# Altium footprint library SAMTEC SMD.PcbLib: 165 footprints (part 10 of 17) (continued)
## SAMTEC_QSH-030-01-L-D-A [mm] "60 (2x30) Contacts, Pitch 0.5mm, Straight Double Row High Speed Ground Plane Socket"
height 3.25
pads (66):
  rect 0.279x2.27 smd mask+0: 1(-7.25,-2.865) 2(-7.25,2.865) 3(-6.75,-2.865) 4(-6.75,2.865) 5(-6.25,-2.865) 6(-6.25,2.865) 7(-5.75,-2.865) 8(-5.75,2.865) 9(-5.25,-2.865) 10(-5.25,2.865) 11(-4.75,-2.865) 12(-4.75,2.865) 13(-4.25,-2.865) 14(-4.25,2.865) 15(-3.75,-2.865) 16(-3.75,2.865) 17(-3.25,-2.865) 18(-3.25,2.865) 19(-2.75,-2.865) 20(-2.75,2.865) 21(-2.25,-2.865) 22(-2.25,2.865) 23(-1.75,-2.865) 24(-1.75,2.865) 25(-1.25,-2.865) 26(-1.25,2.865) 27(-0.75,-2.865) 28(-0.75,2.865) 29(-0.25,-2.865) 30(-0.25,2.865) 31(0.25,-2.865) 32(0.25,2.865) 33(0.75,-2.865) 34(0.75,2.865) 35(1.25,-2.865) 36(1.25,2.865) 37(1.75,-2.865) 38(1.75,2.865) 39(2.25,-2.865) 40(2.25,2.865) 41(2.75,-2.865) 42(2.75,2.865) 43(3.25,-2.865) 44(3.25,2.865) 45(3.75,-2.865) 46(3.75,2.865) 47(4.25,-2.865) 48(4.25,2.865) 49(4.75,-2.865) 50(4.75,2.865) 51(5.25,-2.865) 52(5.25,2.865) 53(5.75,-2.865) 54(5.75,2.865) 55(6.25,-2.865) 56(6.25,2.865) 57(6.75,-2.865) 58(6.75,2.865) 59(7.25,-2.865) 60(7.25,2.865)
  rect 2.54x0.43 smd mask+0: 61(-8.065,0) 64(8.065,0)
  rect 4.7x0.43 smd mask+0: 62(-3.175,0) 63(3.175,0)
  round 0.5 hole 1 unplated mask+0.25: 65(-10.066,2.67) 66(10.066,2.67)
Top Overlay:
  circle w0.25: c-7.992,-4.264 r0.125
  lines w0.2: -10.674,2.007 -10.674,-3.62 -7.79,-3.62 ; -10.674,3.333 -10.674,3.62 -7.79,3.62 ; -9.848,1.797 -10.262,1.383 -10.262,-3.112 -7.79,-3.112 ; -9.193,2.452 -8.533,3.112 -7.79,3.112 ; -7.806,-1.905 -8.325,-1.905 -8.325,-0.737 -7.753,-0.737 ; -7.806,1.905 -8.325,1.905 -8.325,0.737 -7.753,0.737 -7.753,0.425 ; 7.741,-0.425 7.741,-0.73 8.312,-0.73 8.312,-1.905 7.793,-1.905 ; 7.741,0.425 7.741,0.73 8.312,0.73 8.312,1.905 7.793,1.905 ; 7.79,-3.62 10.636,-3.62 10.636,1.974 ; 7.79,-3.112 10.224,-3.112 10.224,1.383 9.795,1.812 ; 7.79,3.112 8.495,3.112 9.208,2.398 ; 7.79,3.62 10.636,3.62 10.636,3.366
Mechanical 8:
  drawing of 396 lines, arcs and shapes, not listed
Mechanical 14:
  circle w0.1: c-7.99,-4.264 r0.25
  lines w0.1: -10.674,-3.62 10.636,-3.62 10.636,3.62 -10.674,3.62 -10.674,-3.62 ; -10.262,-3.112 10.224,-3.112 10.224,1.383 8.495,3.112 -8.533,3.112 -10.262,1.383 -10.262,-3.112 ; -8.325,-1.905 -8.325,-0.737 -7.753,-0.737 -7.753,-0.425 7.741,-0.425 7.741,-0.73 8.312,-0.73 8.312,-1.905 -8.325,-1.905 ; -8.325,0.737 -8.325,1.905 8.312,1.905 8.312,0.73 7.741,0.73 7.741,0.425 -7.753,0.425 -7.753,0.737 -8.325,0.737 ; -7.967,-0.267 -5.427,-0.267 -5.427,0 -7.967,0 -7.967,-0.267 ; -3.501,0 -0.961,0 -0.961,0.267 -3.501,0.267 -3.501,0 ; 0.964,-0.267 3.504,-0.267 3.504,0 0.964,0 0.964,-0.267 ; 5.429,0 7.969,0 7.969,0.267 5.429,0.267 5.429,0
Mechanical 15:
  lines w0.05: -10.924,-4.25 10.886,-4.25 10.886,4.25 -10.924,4.25 -10.924,-4.25
3D body "SAMTEC_QSH-030-01-L-D-A.stp": height 3.25, standoff -0.75, extent -10.674,-3.874 10.636,3.62

## SAMTEC_QSH-060-01-L-D-A [mm] "120 (2x30x2) Contacts, Pitch 0.5mm, Straight Double Row High Speed Ground Plane Socket"
height 3.25
pads (130):
  rect 0.279x2.27 smd mask+0: 1(-17.251,-2.865) 2(-17.251,2.865) 3(-16.751,-2.865) 4(-16.751,2.865) 5(-16.251,-2.865) 6(-16.251,2.865) 7(-15.751,-2.865) 8(-15.751,2.865) 9(-15.251,-2.865) 10(-15.251,2.865) 11(-14.751,-2.865) 12(-14.751,2.865) 13(-14.251,-2.865) 14(-14.251,2.865) 15(-13.751,-2.865) 16(-13.751,2.865) 17(-13.251,-2.865) 18(-13.251,2.865) 19(-12.751,-2.865) 20(-12.751,2.865) 21(-12.251,-2.865) 22(-12.251,2.865) 23(-11.751,-2.865) 24(-11.751,2.865) 25(-11.251,-2.865) 26(-11.251,2.865) 27(-10.751,-2.865) 28(-10.751,2.865) 29(-10.251,-2.865) 30(-10.251,2.865) 31(-9.751,-2.865) 32(-9.751,2.865) 33(-9.251,-2.865) 34(-9.251,2.865) 35(-8.751,-2.865) 36(-8.751,2.865) 37(-8.251,-2.865) 38(-8.251,2.865) 39(-7.751,-2.865) 40(-7.751,2.865) 41(-7.251,-2.865) 42(-7.251,2.865) 43(-6.751,-2.865) 44(-6.751,2.865) 45(-6.251,-2.865) 46(-6.251,2.865) 47(-5.751,-2.865) 48(-5.751,2.865) 49(-5.251,-2.865) 50(-5.251,2.865) 51(-4.751,-2.865) 52(-4.751,2.865) 53(-4.251,-2.865) 54(-4.251,2.865) 55(-3.751,-2.865) 56(-3.751,2.865) 57(-3.251,-2.865) 58(-3.251,2.865) 59(-2.751,-2.865) 60(-2.751,2.865) 61(2.751,-2.865) 62(2.751,2.865) 63(3.251,-2.865) 64(3.251,2.865) 65(3.751,-2.865) 66(3.751,2.865) 67(4.251,-2.865) 68(4.251,2.865) 69(4.751,-2.865) 70(4.751,2.865) 71(5.251,-2.865) 72(5.251,2.865) 73(5.751,-2.865) 74(5.751,2.865) 75(6.251,-2.865) 76(6.251,2.865) 77(6.751,-2.865) 78(6.751,2.865) 79(7.251,-2.865) 80(7.251,2.865) 81(7.751,-2.865) 82(7.751,2.865) 83(8.251,-2.865) 84(8.251,2.865) 85(8.751,-2.865) 86(8.751,2.865) 87(9.251,-2.865) 88(9.251,2.865) 89(9.751,-2.865) 90(9.751,2.865) 91(10.251,-2.865) 92(10.251,2.865) 93(10.751,-2.865) 94(10.751,2.865) 95(11.251,-2.865) 96(11.251,2.865) 97(11.751,-2.865) 98(11.751,2.865) 99(12.251,-2.865) 100(12.251,2.865) 101(12.751,-2.865) 102(12.751,2.865) 103(13.251,-2.865) 104(13.251,2.865) 105(13.751,-2.865) 106(13.751,2.865) 107(14.251,-2.865) 108(14.251,2.865) 109(14.751,-2.865) 110(14.751,2.865) 111(15.251,-2.865) 112(15.251,2.865) 113(15.751,-2.865) 114(15.751,2.865) 115(16.251,-2.865) 116(16.251,2.865) 117(16.751,-2.865) 118(16.751,2.865) 119(17.251,-2.865) 120(17.251,2.865)
  rect 2.54x0.43 smd mask+0: 121(-18.066,0) 124(-1.936,0) 125(1.936,0) 128(18.066,0)
  rect 4.7x0.43 smd mask+0: 122(-13.176,0) 123(-6.826,0) 126(6.826,0) 127(13.176,0)
  round 0.5 hole 1 unplated mask+0.25: 129+(-20.068,2.67) 130(20.066,2.67)
Top Overlay:
  circle w0.25: c-17.993,-4.264 r0.125
  lines w0.2: -20.684,2.015 -20.684,-3.62 -17.791,-3.62 ; -20.684,3.325 -20.684,3.62 -17.791,3.62 ; -20.205,1.781 -20.272,1.714 -20.272,-3.112 -17.791,-3.112 ; -19.177,2.809 -18.875,3.112 -17.791,3.112 ; -17.791,-1.905 -18.334,-1.905 -18.334,-0.737 -17.763,-0.737 -17.763,-0.425 ; -17.791,1.905 -18.334,1.905 -18.334,0.737 -17.763,0.737 -17.763,0.425 ; -2.269,-0.425 -2.269,-0.73 -1.697,-0.73 -1.697,-1.905 -2.241,-1.905 ; -2.269,0.425 -2.269,0.73 -1.697,0.73 -1.697,1.905 -2.241,1.905 ; -2.212,-3.62 2.212,-3.62 ; -2.212,-3.112 2.212,-3.112 ; -2.212,3.112 2.212,3.112 ; -2.212,3.62 2.212,3.62 ; 2.212,-1.905 1.668,-1.905 1.668,-0.737 2.24,-0.737 2.24,-0.425 ; 2.212,1.905 1.668,1.905 1.668,0.737 2.24,0.737 2.24,0.425 ; 17.734,-0.425 17.734,-0.73 18.305,-0.73 18.305,-1.905 17.762,-1.905 ; 17.734,0.425 17.734,0.73 18.305,0.73 18.305,1.905 17.762,1.905 ; 17.791,-3.62 20.629,-3.62 20.629,1.968 ; 17.791,-3.112 20.217,-3.112 20.217,1.714 20.157,1.775 ; 17.791,3.112 18.82,3.112 19.171,2.761 ; 17.791,3.62 20.629,3.62 20.629,3.372
Mechanical 8:
  drawing of 780 lines, arcs and shapes, not listed
Mechanical 14:
  circle w0.1: c-17.991,-4.264 r0.25
  lines w0.1: -20.684,-3.62 20.629,-3.62 20.629,3.62 -20.684,3.62 -20.684,-3.62 ; -20.272,-3.112 -20.272,1.714 -18.875,3.112 18.82,3.112 20.217,1.714 20.217,-3.112 -20.272,-3.112 ; -18.334,-1.905 -18.334,-0.737 -17.763,-0.737 -17.763,-0.425 -2.269,-0.425 -2.269,-0.73 -1.697,-0.73 -1.697,-1.905 -18.334,-1.905 ; -18.334,0.737 -17.763,0.737 -17.763,0.425 -2.269,0.425 -2.269,0.73 -1.697,0.73 -1.697,1.905 -18.334,1.905 -18.334,0.737 ; -17.976,-0.267 -15.436,-0.267 -15.436,0 -17.976,0 -17.976,-0.267 ; -13.511,0 -10.971,0 -10.971,0.267 -13.511,0.267 -13.511,0 ; -9.046,-0.267 -6.506,-0.267 -6.506,0 -9.046,0 -9.046,-0.267 ; -4.58,0 -4.58,0.267 -2.04,0.267 -2.04,0 -4.58,0 ; 1.668,-1.905 18.305,-1.905 18.305,-0.73 17.734,-0.73 17.734,-0.425 2.24,-0.425 2.24,-0.737 1.668,-0.737 1.668,-1.905 ; 1.668,0.737 1.668,1.905 18.305,1.905 18.305,0.73 17.734,0.73 17.734,0.425 2.24,0.425 2.24,0.737 1.668,0.737 ; 2.026,-0.267 2.026,0 4.566,0 4.566,-0.267 2.026,-0.267 ; 6.492,0 6.492,0.267 9.032,0.267 9.032,0 6.492,0 ; 10.957,-0.267 13.497,-0.267 13.497,0 10.957,0 10.957,-0.267 ; 15.422,0 17.962,0 17.962,0.267 15.422,0.267 15.422,0
Mechanical 15:
  lines w0.05: -20.934,-4.25 -20.934,4.25 20.879,4.25 20.879,-4.25 -20.934,-4.25
3D body "SAMTEC_QSH-060-01-L-D-A.stp": height 3.25, standoff -0.75, extent -20.684,-3.746 20.629,3.747

## SAMTEC_QSH-090-01-L-D-A [mm] "180 (3x2x30) Contacts, Pitch 0.5mm, Straight Double Row High Speed Ground Plane Socket"
height 3.25
pads (194):
  rect 0.279x2.27 smd mask+0: 1(-27.252,-2.865) 2(-27.252,2.865) 3(-26.752,-2.865) 4(-26.752,2.865) 5(-26.252,-2.865) 6(-26.252,2.865) 7(-25.752,-2.865) 8(-25.752,2.865) 9(-25.252,-2.865) 10(-25.252,2.865) 11(-24.752,-2.865) 12(-24.752,2.865) 13(-24.252,-2.865) 14(-24.252,2.865) 15(-23.752,-2.865) 16(-23.752,2.865) 17(-23.252,-2.865) 18(-23.252,2.865) 19(-22.752,-2.865) 20(-22.752,2.865) 21(-22.252,-2.865) 22(-22.252,2.865) 23(-21.752,-2.865) 24(-21.752,2.865) 25(-21.252,-2.865) 26(-21.252,2.865) 27(-20.752,-2.865) 28(-20.752,2.865) 29(-20.252,-2.865) 30(-20.252,2.865) 31(-19.752,-2.865) 32(-19.752,2.865) 33(-19.252,-2.865) 34(-19.252,2.865) 35(-18.752,-2.865) 36(-18.752,2.865) 37(-18.252,-2.865) 38(-18.252,2.865) 39(-17.752,-2.865) 40(-17.752,2.865) 41(-17.252,-2.865) 42(-17.252,2.865) 43(-16.752,-2.865) 44(-16.752,2.865) 45(-16.252,-2.865) 46(-16.252,2.865) 47(-15.752,-2.865) 48(-15.752,2.865) 49(-15.252,-2.865) 50(-15.252,2.865) 51(-14.752,-2.865) 52(-14.752,2.865) 53(-14.252,-2.865) 54(-14.252,2.865) 55(-13.752,-2.865) 56(-13.752,2.865) 57(-13.252,-2.865) 58(-13.252,2.865) 59(-12.752,-2.865) 60(-12.752,2.865) 61(-7.25,-2.865) 62(-7.25,2.865) 63(-6.75,-2.865) 64(-6.75,2.865) 65(-6.25,-2.865) 66(-6.25,2.865) 67(-5.75,-2.865) 68(-5.75,2.865) 69(-5.25,-2.865) 70(-5.25,2.865) 71(-4.75,-2.865) 72(-4.75,2.865) 73(-4.25,-2.865) 74(-4.25,2.865) 75(-3.75,-2.865) 76(-3.75,2.865) 77(-3.25,-2.865) 78(-3.25,2.865) 79(-2.75,-2.865) 80(-2.75,2.865) 81(-2.25,-2.865) 82(-2.25,2.865) 83(-1.75,-2.865) 84(-1.75,2.865) 85(-1.25,-2.865) 86(-1.25,2.865) 87(-0.75,-2.865) 88(-0.75,2.865) 89(-0.25,-2.865) 90(-0.25,2.865) 91(0.25,-2.865) 92(0.25,2.865) 93(0.75,-2.865) 94(0.75,2.865) 95(1.25,-2.865) 96(1.25,2.865) 97(1.75,-2.865) 98(1.75,2.865) 99(2.25,-2.865) 100(2.25,2.865) 101(2.75,-2.865) 102(2.75,2.865) 103(3.25,-2.865) 104(3.25,2.865) 105(3.75,-2.865) 106(3.75,2.865) 107(4.25,-2.865) 108(4.25,2.865) 109(4.75,-2.865) 110(4.75,2.865) 111(5.25,-2.865) 112(5.25,2.865) 113(5.75,-2.865) 114(5.75,2.865) 115(6.25,-2.865) 116(6.25,2.865) 117(6.75,-2.865) 118(6.75,2.865) 119(7.25,-2.865) 120(7.25,2.865) 121(12.753,-2.865) 122(12.753,2.865) 123(13.253,-2.865) 124(13.253,2.865) 125(13.753,-2.865) 126(13.753,2.865) 127(14.253,-2.865) 128(14.253,2.865) 129(14.753,-2.865) 130(14.753,2.865) 131(15.253,-2.865) 132(15.253,2.865) 133(15.753,-2.865) 134(15.753,2.865) 135(16.253,-2.865) 136(16.253,2.865) 137(16.753,-2.865) 138(16.753,2.865) 139(17.253,-2.865) 140(17.253,2.865) 141(17.753,-2.865) 142(17.753,2.865) 143(18.253,-2.865) 144(18.253,2.865) 145(18.753,-2.865) 146(18.753,2.865) 147(19.253,-2.865) 148(19.253,2.865) 149(19.753,-2.865) 150(19.753,2.865) 151(20.253,-2.865) 152(20.253,2.865) 153(20.753,-2.865) 154(20.753,2.865) 155(21.253,-2.865) 156(21.253,2.865) 157(21.753,-2.865) 158(21.753,2.865) 159(22.253,-2.865) 160(22.253,2.865) 161(22.753,-2.865) 162(22.753,2.865) 163(23.253,-2.865) 164(23.253,2.865) 165(23.753,-2.865) 166(23.753,2.865) 167(24.253,-2.865) 168(24.253,2.865) 169(24.753,-2.865) 170(24.753,2.865) 171(25.253,-2.865) 172(25.253,2.865) 173(25.753,-2.865) 174(25.753,2.865) 175(26.253,-2.865) 176(26.253,2.865) 177(26.753,-2.865) 178(26.753,2.865) 179(27.253,-2.865) 180(27.253,2.865)
  rect 2.54x0.43 smd mask+0: 181(-28.067,0) 184(-11.937,0) 185(-8.065,0) 188(8.065,0) 189(11.938,0) 192(28.068,0)
  rect 4.7x0.43 smd mask+0: 182(-23.177,0) 183(-16.827,0) 186(-3.175,0) 187(3.175,0) 190(16.828,0) 191(23.178,0)
  round 0.5 hole 1 unplated mask+0.25: 193(-30.069,2.67) 194(30.069,2.67)
Top Overlay:
  lines w0.2: -27.792,-3.617 -30.722,-3.617 -30.722,3.617 -27.792,3.617 ; -27.792,-3.109 -30.31,-3.109 -30.31,1.381 -28.583,3.109 -27.792,3.109 ; -27.792,-1.904 -28.311,-1.904 -28.311,-0.736 -27.74,-0.736 ; -27.792,1.903 -28.311,1.903 -28.311,0.736 -27.74,0.736 ; -12.258,-0.73 -11.686,-0.73 -11.686,-1.904 -12.213,-1.904 ; -12.258,0.73 -11.686,0.73 -11.686,1.903 -12.213,1.903 ; -12.213,-3.617 -7.789,-3.617 ; -12.213,-3.109 -7.789,-3.109 ; -12.213,3.109 -7.789,3.109 ; -12.213,3.617 -7.789,3.617 ; -7.789,-1.904 -8.339,-1.904 -8.339,-0.736 -7.768,-0.736 ; -7.789,1.903 -8.339,1.903 -8.339,0.736 -7.768,0.736 ; 7.715,-0.73 8.286,-0.73 8.286,-1.904 7.79,-1.904 ; 7.715,0.73 8.286,0.73 8.286,1.903 7.79,1.903 ; 7.79,-3.617 12.213,-3.617 ; 7.79,-3.109 12.213,-3.109 ; 7.79,3.109 12.213,3.109 ; 7.79,3.617 12.213,3.617 ; 12.213,-1.904 11.649,-1.904 11.649,-0.736 12.22,-0.736 ; 12.213,1.903 11.649,1.903 11.649,0.736 12.22,0.736 ; 27.702,-0.73 28.273,-0.73 28.273,-1.904 27.792,-1.904 ; 27.702,0.73 28.273,0.73 28.273,1.903 27.792,1.903 ; 27.792,-3.617 30.595,-3.617 30.595,3.617 27.792,3.617 ; 27.792,-3.109 30.183,-3.109 30.183,1.381 28.456,3.109 27.792,3.109
Mechanical 8:
  drawing of 1169 lines, arcs and shapes, not listed
Mechanical 14:
  lines w0.1: -30.722,-3.617 -30.722,3.617 30.595,3.617 30.595,-3.617 -30.722,-3.617 ; -30.31,-3.109 -30.31,1.381 -28.583,3.109 28.456,3.109 30.183,1.381 30.183,-3.109 -30.31,-3.109 ; -28.311,-1.904 -11.686,-1.904 -11.686,-0.73 -12.258,-0.73 -12.258,-0.425 -27.74,-0.425 -27.74,-0.736 -28.311,-0.736 -28.311,-1.904 ; -28.311,0.736 -28.311,1.903 -11.686,1.903 -11.686,0.73 -12.258,0.73 -12.258,0.425 -27.74,0.425 -27.74,0.736 -28.311,0.736 ; -27.953,-0.267 -25.415,-0.267 -25.415,0 -27.953,0 -27.953,-0.267 ; -23.491,0 -23.491,0.266 -20.953,0.266 -20.953,0 -23.491,0 ; -19.029,-0.267 -19.029,0 -16.491,0 -16.491,-0.267 -19.029,-0.267 ; -14.567,0 -14.567,0.266 -12.029,0.266 -12.029,0 -14.567,0 ; -8.339,-1.904 8.286,-1.904 8.286,-0.73 7.715,-0.73 7.715,-0.425 -7.768,-0.425 -7.768,-0.736 -8.339,-0.736 -8.339,-1.904 ; -8.339,0.736 -8.339,1.903 8.286,1.903 8.286,0.73 7.715,0.73 7.715,0.425 -7.768,0.425 -7.768,0.736 -8.339,0.736 ; -7.981,-0.267 -5.443,-0.267 -5.443,0 -7.981,0 -7.981,-0.267 ; -3.519,0 -3.519,0.266 -0.981,0.266 -0.981,0 -3.519,0 ; 0.943,-0.267 0.943,0 3.481,0 3.481,-0.267 0.943,-0.267 ; 5.405,0 5.405,0.266 7.943,0.266 7.943,0 5.405,0 ; 11.649,-1.904 28.273,-1.904 28.273,-0.73 27.702,-0.73 27.702,-0.425 12.22,-0.425 12.22,-0.736 11.649,-0.736 11.649,-1.904 ; 11.649,0.736 11.649,1.903 28.273,1.903 28.273,0.73 27.702,0.73 27.702,0.425 12.22,0.425 12.22,0.736 11.649,0.736 ; 12.006,-0.267 14.545,-0.267 14.545,0 12.006,0 12.006,-0.267 ; 16.468,0 16.468,0.266 19.006,0.266 19.006,0 16.468,0 ; 20.93,-0.267 20.93,0 23.468,0 23.468,-0.267 20.93,-0.267 ; 25.392,0 25.392,0.266 27.93,0.266 27.93,0 25.392,0
Mechanical 15:
  lines w0.05: -30.972,-4.25 -30.972,4.25 30.845,4.25 30.845,-4.25 -30.972,-4.25
3D body "SAMTEC_QSH-090-01-L-D-A.stp": height 3.17, standoff -0.82, extent -30.729,-3.744 30.603,3.744

## SAMTEC_QSH-120-01-L-D-A [mm] "240 (4x2x30) Contacts, Pitch 0.5mm, Straight Double Row High Speed Ground Plane Socket"
height 3.25
pads (258):
  rect 0.279x2.27 smd mask+0: 1(-37.254,-2.865) 2(-37.254,2.865) 3(-36.754,-2.865) 4(-36.754,2.865) 5(-36.254,-2.865) 6(-36.254,2.865) 7(-35.754,-2.865) 8(-35.754,2.865) 9(-35.254,-2.865) 10(-35.254,2.865) 11(-34.754,-2.865) 12(-34.754,2.865) 13(-34.254,-2.865) 14(-34.254,2.865) 15(-33.754,-2.865) 16(-33.754,2.865) 17(-33.254,-2.865) 18(-33.254,2.865) 19(-32.754,-2.865) 20(-32.754,2.865) 21(-32.254,-2.865) 22(-32.254,2.865) 23(-31.754,-2.865) 24(-31.754,2.865) 25(-31.254,-2.865) 26(-31.254,2.865) 27(-30.754,-2.865) 28(-30.754,2.865) 29(-30.254,-2.865) 30(-30.254,2.865) 31(-29.754,-2.865) 32(-29.754,2.865) 33(-29.254,-2.865) 34(-29.254,2.865) 35(-28.754,-2.865) 36(-28.754,2.865) 37(-28.254,-2.865) 38(-28.254,2.865) 39(-27.754,-2.865) 40(-27.754,2.865) 41(-27.254,-2.865) 42(-27.254,2.865) 43(-26.754,-2.865) 44(-26.754,2.865) 45(-26.254,-2.865) 46(-26.254,2.865) 47(-25.754,-2.865) 48(-25.754,2.865) 49(-25.254,-2.865) 50(-25.254,2.865) 51(-24.754,-2.865) 52(-24.754,2.865) 53(-24.254,-2.865) 54(-24.254,2.865) 55(-23.754,-2.865) 56(-23.754,2.865) 57(-23.254,-2.865) 58(-23.254,2.865) 59(-22.754,-2.865) 60(-22.754,2.865) 61(-17.251,-2.865) 62(-17.251,2.865) 63(-16.751,-2.865) 64(-16.751,2.865) 65(-16.251,-2.865) 66(-16.251,2.865) 67(-15.751,-2.865) 68(-15.751,2.865) 69(-15.251,-2.865) 70(-15.251,2.865) 71(-14.751,-2.865) 72(-14.751,2.865) 73(-14.251,-2.865) 74(-14.251,2.865) 75(-13.751,-2.865) 76(-13.751,2.865) 77(-13.251,-2.865) 78(-13.251,2.865) 79(-12.751,-2.865) 80(-12.751,2.865) 81(-12.251,-2.865) 82(-12.251,2.865) 83(-11.751,-2.865) 84(-11.751,2.865) 85(-11.251,-2.865) 86(-11.251,2.865) 87(-10.751,-2.865) 88(-10.751,2.865) 89(-10.251,-2.865) 90(-10.251,2.865) 91(-9.751,-2.865) 92(-9.751,2.865) 93(-9.251,-2.865) 94(-9.251,2.865) 95(-8.751,-2.865) 96(-8.751,2.865) 97(-8.251,-2.865) 98(-8.251,2.865) 99(-7.751,-2.865) 100(-7.751,2.865) 101(-7.251,-2.865) 102(-7.251,2.865) 103(-6.751,-2.865) 104(-6.751,2.865) 105(-6.251,-2.865) 106(-6.251,2.865) 107(-5.751,-2.865) 108(-5.751,2.865) 109(-5.251,-2.865) 110(-5.251,2.865) 111(-4.751,-2.865) 112(-4.751,2.865) 113(-4.251,-2.865) 114(-4.251,2.865) 115(-3.751,-2.865) 116(-3.751,2.865) 117(-3.251,-2.865) 118(-3.251,2.865) 119(-2.751,-2.865) 120(-2.751,2.865) 121(2.751,-2.865) 122(2.751,2.865) 123(3.251,-2.865) 124(3.251,2.865) 125(3.751,-2.865) 126(3.751,2.865) 127(4.251,-2.865) 128(4.251,2.865) 129(4.751,-2.865) 130(4.751,2.865) 131(5.251,-2.865) 132(5.251,2.865) 133(5.751,-2.865) 134(5.751,2.865) 135(6.251,-2.865) 136(6.251,2.865) 137(6.751,-2.865) 138(6.751,2.865) 139(7.251,-2.865) 140(7.251,2.865) 141(7.751,-2.865) 142(7.751,2.865) 143(8.251,-2.865) 144(8.251,2.865) 145(8.751,-2.865) 146(8.751,2.865) 147(9.251,-2.865) 148(9.251,2.865) 149(9.751,-2.865) 150(9.751,2.865) 151(10.251,-2.865) 152(10.251,2.865) 153(10.751,-2.865) 154(10.751,2.865) 155(11.251,-2.865) 156(11.251,2.865) 157(11.751,-2.865) 158(11.751,2.865) 159(12.251,-2.865) 160(12.251,2.865) 161(12.751,-2.865) 162(12.751,2.865) 163(13.251,-2.865) 164(13.251,2.865) 165(13.751,-2.865) 166(13.751,2.865) 167(14.251,-2.865) 168(14.251,2.865) 169(14.751,-2.865) 170(14.751,2.865) 171(15.251,-2.865) 172(15.251,2.865) 173(15.751,-2.865) 174(15.751,2.865) 175(16.251,-2.865) 176(16.251,2.865) 177(16.751,-2.865) 178(16.751,2.865) 179(17.251,-2.865) 180(17.251,2.865) 181(22.754,-2.865) 182(22.754,2.865) 183(23.254,-2.865) 184(23.254,2.865) 185(23.754,-2.865) 186(23.754,2.865) 187(24.254,-2.865) 188(24.254,2.865) 189(24.754,-2.865) 190(24.754,2.865) 191(25.254,-2.865) 192(25.254,2.865) 193(25.754,-2.865) 194(25.754,2.865) 195(26.254,-2.865) 196(26.254,2.865) 197(26.754,-2.865) 198(26.754,2.865) 199(27.254,-2.865) 200(27.254,2.865) 201(27.754,-2.865) 202(27.754,2.865) 203(28.254,-2.865) 204(28.254,2.865) 205(28.754,-2.865) 206(28.754,2.865) 207(29.254,-2.865) 208(29.254,2.865) 209(29.754,-2.865) 210(29.754,2.865) 211(30.254,-2.865) 212(30.254,2.865) 213(30.754,-2.865) 214(30.754,2.865) 215(31.254,-2.865) 216(31.254,2.865) 217(31.754,-2.865) 218(31.754,2.865) 219(32.254,-2.865) 220(32.254,2.865) 221(32.754,-2.865) 222(32.754,2.865) 223(33.254,-2.865) 224(33.254,2.865) 225(33.754,-2.865) 226(33.754,2.865) 227(34.254,-2.865) 228(34.254,2.865) 229(34.754,-2.865) 230(34.754,2.865) 231(35.254,-2.865) 232(35.254,2.865) 233(35.754,-2.865) 234(35.754,2.865) 235(36.254,-2.865) 236(36.254,2.865) 237(36.754,-2.865) 238(36.754,2.865) 239(37.254,-2.865) 240(37.254,2.865)
  rect 2.54x0.43 smd mask+0: 241(-38.069,0) 244(-21.939,0) 245(-18.066,0) 248(-1.936,0) 249(1.936,0) 252(18.066,0) 253(21.939,0) 256(38.069,0)
  rect 4.7x0.43 smd mask+0: 242(-33.179,0) 243(-26.829,0) 246(-13.176,0) 247(-6.826,0) 250(6.826,0) 251(13.176,0) 254(26.829,0) 255(33.179,0)
  round 0.5 hole 1 unplated mask+0.25: 257(-40.07,2.67) 258(40.07,2.67)
Top Overlay:
  circle w0.25: c-37.996,-4.264 r0.125
  lines w0.2: -37.793,-3.617 -40.723,-3.617 -40.723,3.617 -37.793,3.617 ; -37.793,-3.109 -40.311,-3.109 -40.311,1.382 -38.584,3.109 -37.793,3.109 ; -37.793,-1.904 -38.312,-1.904 -38.312,-0.736 -37.741,-0.736 ; -37.793,1.904 -38.312,1.904 -38.312,0.736 -37.741,0.736 ; -22.259,-0.73 -21.688,-0.73 -21.688,-1.904 -22.214,-1.904 ; -22.259,0.73 -21.688,0.73 -21.688,1.904 -22.214,1.904 ; -22.214,-3.617 -17.791,-3.617 ; -22.214,-3.109 -17.791,-3.109 ; -22.214,3.109 -17.791,3.109 ; -22.214,3.617 -17.791,3.617 ; -17.791,-1.904 -18.325,-1.904 -18.325,-0.736 -17.754,-0.736 ; -17.791,1.904 -18.325,1.904 -18.325,0.736 -17.754,0.736 ; -2.272,-0.73 -1.7,-0.73 -1.7,-1.904 -2.212,-1.904 ; -2.272,0.73 -1.7,0.73 -1.7,1.904 -2.212,1.904 ; -2.212,-3.617 2.212,-3.617 ; -2.212,-3.109 2.212,-3.109 ; -2.212,3.109 2.212,3.109 ; -2.212,3.617 2.212,3.617 ; 2.212,-1.904 1.662,-1.904 1.662,-0.736 2.234,-0.736 ; 2.212,1.904 1.662,1.904 1.662,0.736 2.234,0.736 ; 17.716,-0.73 18.287,-0.73 18.287,-1.904 17.791,-1.904 ; 17.716,0.73 18.287,0.73 18.287,1.904 17.791,1.904 ; 17.791,-3.617 22.214,-3.617 ; 17.791,-3.109 22.214,-3.109 ; 17.791,3.109 22.214,3.109 ; 17.791,3.617 22.214,3.617 ; 22.214,-1.904 21.65,-1.904 21.65,-0.736 22.221,-0.736 ; 22.214,1.904 21.65,1.904 21.65,0.736 22.221,0.736 ; 37.703,-0.73 38.274,-0.73 38.274,-1.904 37.793,-1.904 ; 37.703,0.73 38.274,0.73 38.274,1.904 37.793,1.904 ; 37.793,-3.617 40.597,-3.617 40.597,3.617 37.793,3.617 ; 37.793,-3.109 40.185,-3.109 40.185,1.382 38.457,3.109 37.793,3.109
Mechanical 8:
  drawing of 1548 lines, arcs and shapes, not listed
Mechanical 14:
  circle w0.1: c-37.994,-4.264 r0.25
  lines w0.1: -40.723,-3.617 -40.723,3.617 40.597,3.617 40.597,-3.617 -40.723,-3.617 ; -40.311,-3.109 -40.311,1.382 -38.584,3.109 38.457,3.109 40.185,1.382 40.185,-3.109 -40.311,-3.109 ; -38.312,-1.904 -21.688,-1.904 -21.688,-0.73 -22.259,-0.73 -22.259,-0.425 -37.741,-0.425 -37.741,-0.736 -38.312,-0.736 -38.312,-1.904 ; -38.312,0.736 -38.312,1.904 -21.688,1.904 -21.688,0.73 -22.259,0.73 -22.259,0.425 -37.741,0.425 -37.741,0.736 -38.312,0.736 ; -37.954,-0.266 -35.416,-0.266 -35.416,0 -37.954,0 -37.954,-0.266 ; -33.492,0 -33.492,0.266 -30.954,0.266 -30.954,0 -33.492,0 ; -29.03,-0.266 -29.03,0 -26.492,0 -26.492,-0.266 -29.03,-0.266 ; -24.568,0 -24.568,0.266 -22.03,0.266 -22.03,0 -24.568,0 ; -18.325,-1.904 -1.7,-1.904 -1.7,-0.73 -2.272,-0.73 -2.272,-0.425 -17.754,-0.425 -17.754,-0.736 -18.325,-0.736 -18.325,-1.904 ; -18.325,0.736 -18.325,1.904 -1.7,1.904 -1.7,0.73 -2.272,0.73 -2.272,0.425 -17.754,0.425 -17.754,0.736 -18.325,0.736 ; -17.967,-0.266 -15.429,-0.266 -15.429,0 -17.967,0 -17.967,-0.266 ; -13.505,0 -13.505,0.266 -10.967,0.266 -10.967,0 -13.505,0 ; -9.043,-0.266 -9.043,0 -6.505,0 -6.505,-0.266 -9.043,-0.266 ; -4.581,0 -4.581,0.266 -2.043,0.266 -2.043,0 -4.581,0 ; 1.662,-1.904 18.287,-1.904 18.287,-0.73 17.716,-0.73 17.716,-0.425 2.234,-0.425 2.234,-0.736 1.662,-0.736 1.662,-1.904 ; 1.662,0.736 1.662,1.904 18.287,1.904 18.287,0.73 17.716,0.73 17.716,0.425 2.234,0.425 2.234,0.736 1.662,0.736 ; 2.02,-0.266 4.558,-0.266 4.558,0 2.02,0 2.02,-0.266 ; 6.482,0 6.482,0.266 9.02,0.266 9.02,0 6.482,0 ; 10.944,-0.266 10.944,0 13.482,0 13.482,-0.266 10.944,-0.266 ; 15.406,0 15.406,0.266 17.944,0.266 17.944,0 15.406,0 ; 21.65,-1.904 38.274,-1.904 38.274,-0.73 37.703,-0.73 37.703,-0.425 22.221,-0.425 22.221,-0.736 21.65,-0.736 21.65,-1.904 ; 21.65,0.736 21.65,1.904 38.274,1.904 38.274,0.73 37.703,0.73 37.703,0.425 22.221,0.425 22.221,0.736 21.65,0.736 ; 22.008,-0.266 24.546,-0.266 24.546,0 22.008,0 22.008,-0.266 ; 26.47,0 26.47,0.266 29.008,0.266 29.008,0 26.47,0 ; 30.932,-0.266 30.932,0 33.47,0 33.47,-0.266 30.932,-0.266 ; 35.393,0 35.393,0.266 37.932,0.266 37.932,0 35.393,0
Mechanical 15:
  lines w0.05: -40.973,-4.25 -40.973,4.25 40.847,4.25 40.847,-4.25 -40.973,-4.25
3D body "SAMTEC_QSH-120-01-L-D-A.stp": height 3.17, standoff -0.82, extent -40.723,-3.744 40.597,3.744

## SAMTEC_QSS-016-01-L-D-DP-A-K-TR [mm] "32 Contacts Female, Pitch 0.635mm, Straight Double Row Differential Pair High Speed Board to Board Socket"
height 3.63
pads (38):
  rect 0.406x2.273 smd mask+0: 1(-7.62,-2.865) 2(-7.62,2.865) 3(-6.985,-2.865) 4(-6.985,2.865) 5(-5.715,-2.865) 6(-5.715,2.865) 7(-5.08,-2.865) 8(-5.08,2.865) 9(-3.81,-2.865) 10(-3.81,2.865) 11(-3.175,-2.865) 12(-3.175,2.865) 13(-1.905,-2.865) 14(-1.905,2.865) 15(-1.27,-2.865) 16(-1.27,2.865) 17(0,-2.865) 18(0,2.865) 19(0.635,-2.865) 20(0.635,2.865) 21(1.905,-2.865) 22(1.905,2.865) 23(2.54,-2.865) 24(2.54,2.865) 25(3.81,-2.865) 26(3.81,2.865) 27(4.445,-2.865) 28(4.445,2.865) 29(5.715,-2.865) 30(5.715,2.865) 31(6.35,-2.865) 32(6.35,2.865)
  rect 2.794x0.432 smd mask+0: 33(-8.064,0) 36(8.065,0)
  rect 4.699x0.432 smd mask+0: 34(-3.174,0) 35(3.178,0)
  round 0.5 hole 1 unplated mask+0.25: 163(-9.997,2.657) 164(10.001,2.657)
Top Overlay:
  circle w0.25: c-7.6,-4.54 r0.125
  lines w0.2: -10.636,-1.968 -10.077,-1.968 ; -10.636,1.968 -10.581,1.968 ; -10.636,2.019 -10.636,-3.62 -8.223,-3.62 ; -10.636,3.295 -10.636,3.62 -8.223,3.62 ; -10.035,1.757 -10.077,1.714 -10.077,-3.112 -8.223,-3.112 ; -9.102,2.69 -8.68,3.112 -8.223,3.112 ; -8.223,-1.905 -8.318,-1.905 -8.318,-0.73 -8.223,-0.73 ; -8.223,0.73 -8.318,0.73 -8.318,1.905 -8.223,1.905 ; 6.953,-3.62 10.636,-3.62 10.636,2.019 ; 6.953,-3.112 10.077,-3.112 10.077,1.714 10.035,1.757 ; 6.953,-1.27 7.089,-1.27 7.089,-1.905 7.521,-1.905 7.521,-1.27 7.724,-1.27 7.724,-1.905 8.319,-1.905 8.319,-0.73 7.747,-0.73 7.747,-0.616 ; 6.953,1.27 7.084,1.27 7.084,1.905 7.516,1.905 7.516,1.27 7.719,1.27 7.719,1.905 8.319,1.905 8.319,0.73 7.747,0.73 7.747,0.616 ; 6.953,3.112 8.68,3.112 9.102,2.69 ; 6.953,3.62 10.636,3.62 10.636,3.295 ; 10.077,-1.968 10.636,-1.968 ; 10.581,1.968 10.636,1.968
Mechanical 8:
  drawing of 240 lines, arcs and shapes, not listed
Mechanical 14:
  drawing of 247 lines, arcs and shapes, not listed
Mechanical 15:
  lines w0.05: -10.886,-4.252 10.886,-4.252 10.886,4.252 -10.886,4.252 -10.886,-4.252
3D body "SAMTEC_QSS-016-01-L-D-DP-A-K-TR.stp": height 3.63, standoff -0.81, extent -10.636,-3.746 10.636,3.747